# Altium footprint library miniVent.PcbLib: 4 footprints
Each footprint in its own frame and in the unit in brackets; x right, y up, seen from the top. Pads: shape width x height; smd on the part's side, far side on the other; paste and mask are expansions set on the pad; w line width, h text height; cw(c..) or ccw(c..) is an arc to the next point about the centre after c.
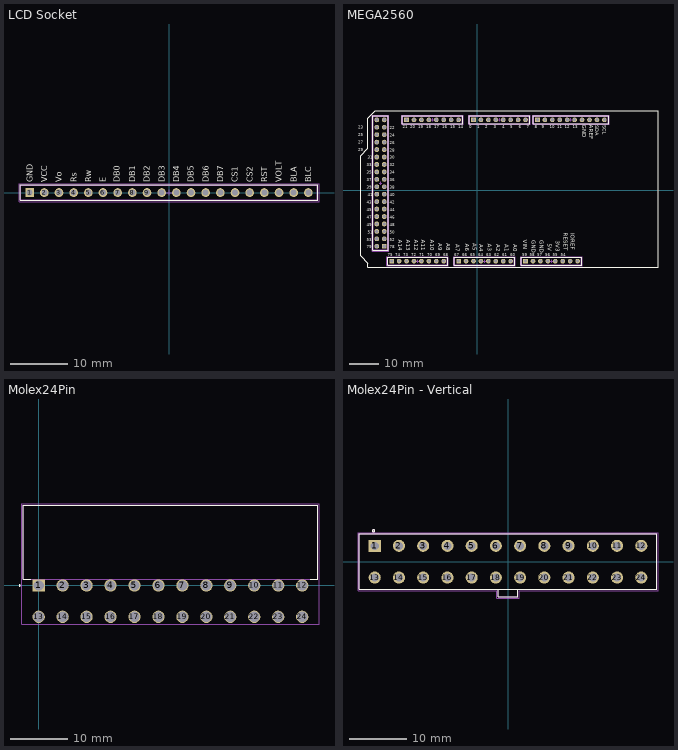
[diagram p0: the footprints below, top view; thin cyan lines are the x and y axes]

## LCD Socket [mm] "Socket Header, Pitch 2.54 mm, THT, Vertical, single row, 20p"
height 8.5
pads (20):
  rect 1.52x1.52 hole 1.02: 1(-24.13,0)
  round 1.52 hole 1.02: 2(-21.59,0) 3(-19.05,0) 4(-16.51,0) 5(-13.97,0) 6(-11.43,0) 7(-8.89,0) 8(-6.35,0) 9(-3.81,0) 10(-1.27,0) 11(1.27,0) 12(3.81,0) 13(6.35,0) 14(8.89,0) 15(11.43,0) 16(13.97,0) 17(16.51,0) 18(19.05,0) 19(21.59,0) 20(24.13,0)
Top Overlay:
  lines w0.2: -25.775,-1.35 25.775,-1.35 25.775,1.35 -25.775,1.35 -25.775,-1.35
  text "BLC" at 24.638,1.778 h1.02
  text "BLA" at 22.098,1.778 h1.02
  text "VOLT" at 19.558,1.778 h1.02
  text "RST" at 17.018,1.778 h1.02
  text "CS2" at 14.478,1.778 h1.02
  text "CS1" at 11.938,1.778 h1.02
  text "DB7" at 9.398,1.778 h1.02
  text "DB6" at 6.858,1.778 h1.02
  text "DB5" at 4.318,1.778 h1.02
  text "DB4" at 1.778,1.778 h1.02
  text "DB3" at -0.762,1.778 h1.02
  text "DB2" at -3.302,1.778 h1.02
  text "DB1" at -5.842,1.778 h1.02
  text "DB0" at -8.509,1.778 h1.02
  text "E" at -10.922,1.778 h1.02
  text "Rw" at -13.462,1.778 h1.02
  text "VCC" at -21.082,1.778 h1.02
  text "Rs" at -16.002,1.778 h1.02
  text "Vo" at -18.542,1.778 h1.02
  text "GND" at -23.622,1.778 h1.02
Mechanical 13:
  lines w0.1: -25.65,-1.25 25.65,-1.25 25.65,1.25 -25.65,1.25 -25.65,-1.25
Mechanical 15:
  lines w0.05: -0.5,0 0.5,0 ; 0,-0.5 0,0.5 ; -25.975,-1.55 25.975,-1.55 25.975,1.55 -25.975,1.55 -25.975,-1.55
3D body "61302011821.stp": height 8.55, standoff -3.06, extent -25.65,-1.25 25.65,1.25

## MEGA2560 [mm] "Arduino 2560"
pads (86):
  rect 1.6x1.6 hole 1.1: 0(-1.27,24.13) 8(20.574,24.13) 21(-24.13,24.13) 59(16.51,-24.13) 67(-6.35,-24.13) 75(-29.21,-24.13)
  round 1.6 hole 1.1: 1(1.27,24.13) 2(3.81,24.13) 3(6.35,24.13) 4(8.89,24.13) 5(11.43,24.13) 6(13.97,24.13) 7(16.51,24.13) 9(23.114,24.13) 10(25.654,24.13) 11(28.194,24.13) 12(30.734,24.13) 13(33.274,24.13) 14(-6.35,24.13) 15(-8.89,24.13) 16(-11.43,24.13) 17(-13.97,24.13) 18(-16.51,24.13) 19(-19.05,24.13) 20(-21.59,24.13) 54(29.21,-24.13) 55(26.67,-24.13) 56(24.13,-24.13) 57(21.59,-24.13) 58(19.05,-24.13) 60(11.43,-24.13) 61(8.89,-24.13) 62(6.35,-24.13) 63(3.81,-24.13) 64(1.27,-24.13) 65(-1.27,-24.13) 66(-3.81,-24.13) 68(-11.43,-24.13) 69(-13.97,-24.13) 70(-16.51,-24.13) 71(-19.05,-24.13) 72(-21.59,-24.13) 73(-24.13,-24.13) 74(-26.67,-24.13) 76(35.814,24.13) 77(38.354,24.13) 82(40.894,24.13) 83(43.434,24.13) 84(31.75,-24.13) 85(34.29,-24.13)
  round 1.65 hole 1.1: 22(-31.75,21.59) 23(-34.29,21.59) 24(-31.75,19.05) 25(-34.29,19.05) 26(-31.75,16.51) 27(-34.29,16.51) 28(-31.75,13.97) 29(-34.29,13.97) 30(-31.75,11.43) 31(-34.29,11.43) 32(-31.75,8.89) 33(-34.29,8.89) 34(-31.75,6.35) 35(-34.29,6.35) 36(-31.75,3.81) 37(-34.29,3.81) 38(-31.75,1.27) 39(-34.29,1.27) 40(-31.75,-1.27) 41(-34.29,-1.27) 42(-31.75,-3.81) 43(-34.29,-3.81) 44(-31.75,-6.35) 45(-34.29,-6.35) 46(-31.75,-8.89) 47(-34.29,-8.89) 48(-31.75,-11.43) 49(-34.29,-11.43) 50(-31.75,-13.97) 51(-34.29,-13.97) 52(-31.75,-16.51) 53(-34.29,-16.51) 79(-34.29,-19.05) 80(-34.29,24.13) 81(-31.75,24.13)
  rect 1.65x1.65 hole 1.1: 78(-31.75,-19.05)
Top Overlay:
  lines w0.2: -35.635,-20.47 -30.405,-20.47 -30.405,25.55 -35.635,25.55 -35.635,-20.47 ; -30.63,-25.475 -10.01,-25.475 -10.01,-22.785 -30.63,-22.785 -30.63,-25.475 ; -25.55,22.785 -4.93,22.785 -4.93,25.475 -25.55,25.475 -25.55,22.785 ; -7.77,-25.475 12.85,-25.475 12.85,-22.785 -7.77,-22.785 -7.77,-25.475 ; -2.69,22.785 17.93,22.785 17.93,25.475 -2.69,25.475 -2.69,22.785 ; 15.09,-25.475 35.71,-25.475 35.71,-22.785 15.09,-22.785 15.09,-25.475 ; 19.154,22.785 19.154,25.475 44.854,25.475 44.854,22.785 19.154,22.785
  lines w0.254: -37.31,14.469 -39.85,11.929 -39.85,-22.351 -37.31,-24.891 -37.31,-26.161 60.11,-26.161 61.75,-26.161 61.75,-24.521 61.75,27.179 -34.77,27.179 -37.31,24.639 -37.31,14.479
  text "GND" at 35.28,22.452 h2.36
  text "AREF" at 37.82,22.452 h2.36
  text "SCL" at 42.879,22.331 h1.21
  text "SDA" at 40.288,22.331 h1.21
  text "14" at -6.398,21.284 h1.02
  text "15" at -9.138,21.284 h1.02
  text "16" at -11.878,21.284 h1.02
  text "17" at -14.617,21.284 h1.02
  text "18" at -17.357,21.284 h1.02
  text "19" at -20.096,21.284 h1.02
  text "20" at -22.836,21.284 h1.02
  text "21" at -25.423,21.284 h1.02
  text "7" at 16.97,21.284 h1.02
  text "6" at 14.139,21.284 h1.02
  text "5" at 11.309,21.284 h1.02
  text "4" at 8.479,21.284 h1.02
  text "3" at 5.648,21.284 h1.02
  text "2" at 2.818,21.284 h1.02
  text "1" at -0.012,21.284 h1.02
  text "0" at -2.69,21.284 h1.02
  text "8" at 19.662,21.284 h1.02
  text "13" at 32.554,21.284 h1.02
  text "12" at 29.945,21.284 h1.02
  text "11" at 27.336,21.284 h1.02
  text "10" at 24.727,21.284 h1.02
  text "9" at 22.119,21.284 h1.02
  text "22" at -29.92,20.953 h1.02
  text "24" at -29.92,18.405 h1.02
  text "26" at -29.92,15.857 h1.02
  text "28" at -29.92,13.309 h1.02
  text "30" at -29.92,10.761 h1.02
  text "32" at -29.92,8.213 h1.02
  text "34" at -29.92,5.665 h1.02
  text "36" at -29.92,3.117 h1.02
  text "38" at -29.92,0.569 h1.02
  text "40" at -29.92,-1.979 h1.02
  text "42" at -29.92,-4.527 h1.02
  text "44" at -29.92,-7.075 h1.02
  text "46" at -29.92,-9.623 h1.02
  text "48" at -29.92,-12.171 h1.02
  text "50" at -29.92,-14.719 h1.02
  text "52" at -29.92,-17.266 h1.02
  text "78" at -29.92,-19.662 h1.02
  text "23" at -40.715,21.08 h1.02
  text "25" at -40.715,18.532 h1.02
  text "27" at -40.715,15.984 h1.02
  text "29" at -40.715,13.436 h1.02
  text "31" at -37.455,10.761 h1.02
  text "33" at -37.794,8.213 h1.02
  text "35" at -37.794,5.665 h1.02
  text "37" at -37.794,3.117 h1.02
  text "39" at -37.794,0.569 h1.02
  text "41" at -37.455,-1.979 h1.02
  text "43" at -37.794,-4.527 h1.02
  text "45" at -37.794,-7.075 h1.02
  text "47" at -37.794,-9.623 h1.02
  text "49" at -37.794,-12.171 h1.02
  text "51" at -37.455,-14.719 h1.02
  text "53" at -37.794,-17.266 h1.02
  text "79" at -37.794,-19.662 h1.02
  text "68" at -11.587,-22.427 h1.02
  text "69" at -14.346,-22.427 h1.02
  text "70" at -17.086,-22.427 h1.02
  text "71" at -19.825,-22.427 h1.02
  text "72" at -22.565,-22.427 h1.02
  text "73" at -25.304,-22.427 h1.02
  text "74" at -28.044,-22.427 h1.02
  text "75" at -30.631,-22.427 h1.02
  text "60" at 11.255,-22.427 h1.02
  text "61" at 8.515,-22.427 h1.02
  text "62" at 5.775,-22.427 h1.02
  text "63" at 3.036,-22.427 h1.02
  text "64" at 0.296,-22.427 h1.02
  text "65" at -2.443,-22.427 h1.02
  text "66" at -5.135,-22.427 h1.02
  text "67" at -7.77,-22.427 h1.02
  text "59" at 15.446,-22.427 h1.02
  text "58" at 17.935,-22.427 h1.02
  text "54" at 28.501,-22.427 h1.02
  text "55" at 25.86,-22.427 h1.02
  text "56" at 23.218,-22.427 h1.02
  text "57" at 20.576,-22.427 h1.02
  text "IOREF" at 31.496,-14.598 h2.36
  text "RESET" at 29.096,-14.51 h2.36
  text "3V3" at 26.336,-17.183 h2.36
  text "5V" at 23.575,-18.256 h2.36
  text "GND" at 20.814,-16.992 h2.36
  text "GND" at 18.054,-16.992 h2.36
  text "A0" at 11.762,-18.288 h2.36
  text "A1" at 8.858,-18.288 h2.36
  text "A2" at 5.953,-18.302 h2.36
  text "VIN" at 15.293,-16.886 h2.36
  text "A3" at 3.048,-18.263 h2.36
  text "A4" at 0.144,-18.306 h2.36
  text "A5" at -2.058,-18.07 h2.36
  text "A6" at -4.598,-18.237 h2.36
  text "A7" at -7.922,-18.309 h2.36
  text "A8" at -11.049,-18.098 h2.36
  text "A9" at -13.808,-18.045 h2.36
  text "A10" at -16.548,-16.846 h2.36
  text "A11" at -19.612,-16.846 h2.36
  text "A13" at -24.767,-16.82 h2.36
  text "A12" at -22.027,-16.859 h2.36
  text "A14" at -27.492,-16.864 h2.36
Bottom Overlay:
  text "3mm" at 50.419,21.336 h1.52
  text "3mm" at 47.625,-21.463 h1.52
  text "ARDUINO MEGA 2560 / '.Hole_Count' PIN" at -8.227,-2.158 h1.52
Mechanical 13:
  lines w0.1: -35.56,-20.32 -35.56,25.4 -30.48,25.4 -30.48,-20.32 -35.56,-20.32 ; -30.48,-25.4 -30.48,-22.86 -10.16,-22.86 -10.16,-25.4 -30.48,-25.4 ; -25.4,22.86 -25.4,25.4 -5.08,25.4 -5.08,22.86 -25.4,22.86 ; -7.62,-25.4 -7.62,-22.86 12.7,-22.86 12.7,-25.4 -7.62,-25.4 ; -2.54,22.86 -2.54,25.4 17.78,25.4 17.78,22.86 -2.54,22.86 ; 15.24,-25.4 15.24,-22.86 35.56,-22.86 35.56,-25.4 15.24,-25.4 ; 19.304,22.86 44.704,22.86 44.704,25.4 19.304,25.4 19.304,22.86
Mechanical 15:
  lines w0.05: -33.52,2.54 -32.52,2.54 ; -33.02,2.04 -33.02,3.04 ; -20.82,-24.13 -19.82,-24.13 ; -20.32,-24.63 -20.32,-23.63 ; -15.74,24.13 -14.74,24.13 ; -15.24,23.63 -15.24,24.63 ; 2.04,-24.13 3.04,-24.13 ; 2.54,-24.63 2.54,-23.63 ; 7.12,24.13 8.12,24.13 ; 7.62,23.63 7.62,24.63 ; 24.9,-24.13 25.9,-24.13 ; 25.4,-24.63 25.4,-23.63 ; 31.504,24.13 32.504,24.13 ; 32.004,23.63 32.004,24.63 ; -35.835,-20.67 -30.205,-20.67 -30.205,25.75 -35.835,25.75 -35.835,-20.67 ; -30.83,-25.675 -30.83,-22.585 -9.81,-22.585 -9.81,-25.675 -30.83,-25.675 ; -25.75,22.585 -25.75,25.675 -4.73,25.675 -4.73,22.585 -25.75,22.585 ; -7.97,-25.675 -7.97,-22.585 13.05,-22.585 13.05,-25.675 -7.97,-25.675 ; -2.89,22.585 -2.89,25.675 18.13,25.675 18.13,22.585 -2.89,22.585 ; 14.89,-25.675 14.89,-22.585 35.91,-22.585 35.91,-25.675 14.89,-25.675 ; 18.954,22.585 45.054,22.585 45.054,25.675 18.954,25.675 18.954,22.585
3D body "61300811121.stp": height 8.57, standoff -2.97, extent -25.4,22.86 -5.08,25.4
3D body "61300811121.stp": height 8.57, standoff -2.97, extent -2.54,22.86 17.78,25.4
3D body "61303621121.stp": height 8.59, standoff -2.95, extent -35.56,-20.32 -30.48,25.4
3D body "61300811121.stp": height 8.57, standoff -2.97, extent -30.48,-25.4 -10.16,-22.86
3D body "61300811121.stp": height 8.57, standoff -2.97, extent -7.62,-25.4 12.7,-22.86
3D body "61301011121.stp": height 8.57, standoff -2.97, extent 19.304,22.86 44.704,25.4
3D body "61300811121.stp": height 8.57, standoff -2.97, extent 15.24,-25.4 35.56,-22.86
3D body "arduino MEGA2650.SLDPRT": height 16.2, standoff 0.95, extent -39.878,-26.162 68.072,27.178

## Molex24Pin [mm] "Molex ATX 24Pin"
height 8.54
pads (24):
  rect 2.15x2.15 hole 1.8: 1(0,0)
  round 2.15 hole 1.8: 2(4.2,0) 3(8.4,0) 4(12.6,0) 5(16.8,0) 6(21,0) 7(25.2,0) 8(29.4,0) 9(33.6,0) 10(37.8,0) 11(42,0) 12(46.2,0) 13(0,-5.5) 14(4.2,-5.5) 15(8.4,-5.5) 16(12.6,-5.5) 17(16.8,-5.5) 18(21,-5.5) 19(25.2,-5.5) 20(29.4,-5.5) 21(33.6,-5.5) 22(37.8,-5.5) 23(42,-5.5) 24(46.2,-5.5)
Top Overlay:
  circle w0.2: c-3.35,0 r0.1
  lines w0.127: -1.395,1.1 -2.7,1.1 -2.7,14.1 48.9,14.1 48.9,1.1 47.595,1.1
Mechanical 13:
  circle w0.2: c-3.35,0 r0.1
  lines w0.127: -2.7,1.1 -2.7,14.1 ; -2.7,1.1 48.9,1.1 ; -2.7,1.1 -2.7,14.1 ; -2.7,14.1 48.9,14.1 ; -2.7,14.1 48.9,14.1 ; 48.9,1.1 48.9,14.1 ; 48.9,1.1 48.9,14.1
Mechanical 15:
  lines w0.05: -2.95,-6.825 49.15,-6.825 49.15,14.35 -2.95,14.35 -2.95,-6.825
3D body "c-2-1586041-4-b-3d.stp": height 11.75, standoff -3.05, extent -3.302,-6.004 48.798,14.132

## Molex24Pin - Vertical [mm] "Molex ATX 24Pin"
height 8.54
pads (24):
  rect 2.1x2.1 hole 1.4: 1(-23.1,2.75)
  round 2.1 hole 1.4: 2(-18.9,2.75) 3(-14.7,2.75) 4(-10.5,2.75) 5(-6.3,2.75) 6(-2.1,2.75) 7(2.1,2.75) 8(6.3,2.75) 9(10.5,2.75) 10(14.7,2.75) 11(18.9,2.75) 12(23.1,2.75) 13(-23.1,-2.75) 14(-18.9,-2.75) 15(-14.7,-2.75) 16(-10.5,-2.75) 17(-6.3,-2.75) 18(-2.1,-2.75) 19(2.1,-2.75) 20(6.3,-2.75) 21(10.5,-2.75) 22(14.7,-2.75) 23(18.9,-2.75) 24(23.1,-2.75)
Top Overlay:
  circle w0.203: c-23.3,5.35 r0.2
  lines w0.127: -1.7,-4.8 -1.7,-6.1 1.7,-6.1 1.7,-4.8 ; -1.7,-4.8 -25.75,-4.8 -25.75,4.8 25.75,4.8 25.75,-4.8 1.7,-4.8 ; -1.7,-4.8 1.7,-4.8
Mechanical 13:
  circle w0.203: c-23.3,5.35 r0.2
  lines w0.127: -1.7,-4.8 -1.7,-6.1 1.7,-6.1 1.7,-4.8 ; -1.7,-4.8 1.7,-4.8 ; -1.7,-4.8 -25.75,-4.8 -25.75,4.8 25.75,4.8 25.75,-4.8 1.7,-4.8
Mechanical 15:
  lines w0.05: -26,-5.05 -26,-4.04 -26,-0.54 -26,5.05 26,5.05 26,-5.05 1.95,-5.05 1.95,-6.35 -1.95,-6.35 -1.95,-5.05 -26,-5.05
3D body "plug_cpu_power_male_24-pin.stp": height 38.1, standoff 18.51, extent -26,-8.9 26,5.9
3D body "plug_cpu_power_female_24-pin.stp": height 24.88, standoff 0, extent -26.95,-6.4 26.95,5.9